# Altium footprint library con-molex.PCBLIB: 368 footprints (part 1 of 26)
Each footprint in its own frame and in the unit in brackets; x right, y up, seen from the top. Pads: shape width x height; smd on the part's side, far side on the other; paste and mask are expansions set on the pad; w line width, h text height; cw(c..) or ccw(c..) is an arc to the next point about the centre after c.
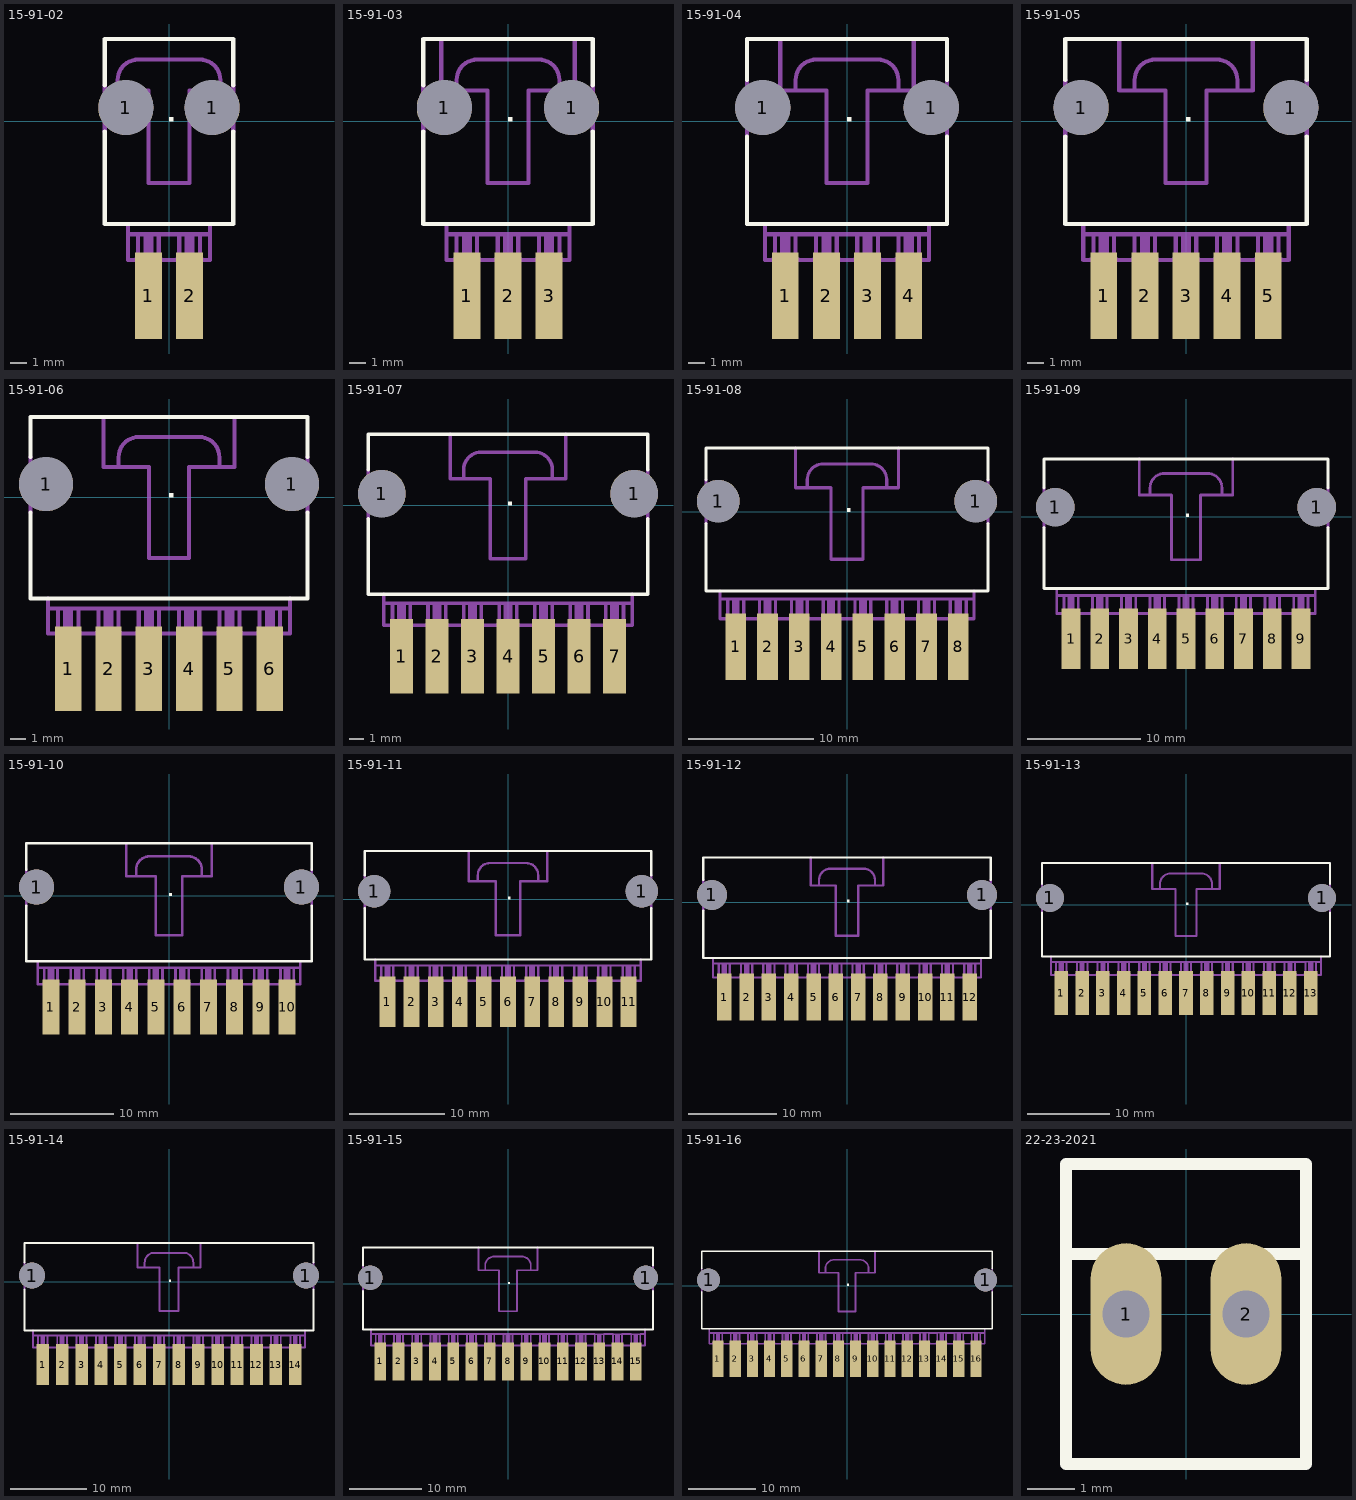
[diagram p0: the footprints below, top view; thin cyan lines are the x and y axes]

## 15-91-02 [mil]
pads (4):
  round 134 hole 134: 1(-105,33) 1(105,33)
  rect 65x210 smd: 1(-50,-425) 2(50,-425)
Top Overlay:
  region: 0,0 10,0 10,10 0,10
  lines w10: -156.25,-25 -156.25,-250 156.25,-250 156.25,-25 ; -156.25,87.5 -156.25,200 156.25,200 156.25,87.5
Mechanical 16:
  rectangle: -62.5,-425 -37.5,-275
  rectangle: 37.5,-425 62.5,-275
  lines w10: -156.25,-25 -156.25,75 ; -156.25,87.5 -156.25,75 ; -100,-275 -75,-275 ; -100,-250 -100,-337.5 -85,-337.5 ccw(c-85,-327.5) -75,-327.5 -75,-275 ; 100,-275 75,-275 ; 100,-250 100,-337.5 85,-337.5 cw(c85,-327.5) 75,-327.5 75,-275 ; 156.25,-25 156.25,75 ; 156.25,87.5 156.25,75 ; -156.25,75 -125,75 ; -125,75 -50,75 -50,-150 50,-150 50,75 125,75 ; -125,75 -125,100 cw(c-75,100) -75,150 75,150 cw(c75,100) 125,100 125,75 ; -75,-275 -25,-275 ; -25,-275 25,-275 ; -25,-275 -25,-327.5 ccw(c-15,-327.5) -15,-337.5 15,-337.5 ccw(c15,-327.5) 25,-327.5 25,-275 ; 25,-275 75,-275 ; 125,75 156.25,75

## 15-91-03 [mil]
pads (5):
  round 134 hole 134: 1(-155,33) 1(155,33)
  rect 65x210 smd: 1(-100,-425) 2(0,-425) 3(100,-425)
Top Overlay:
  region: 0,0 10,0 10,10 0,10
  lines w10: -206.25,-25 -206.25,-250 206.25,-250 206.25,-25 ; -206.25,87.5 -206.25,200 206.25,200 206.25,87.5
Mechanical 16:
  rectangle: -112.5,-425 -87.5,-275
  rectangle: -12.5,-425 12.5,-275
  rectangle: 87.5,-425 112.5,-275
  lines w10: -206.25,-25 -206.25,87.5 ; -162.5,200 -162.5,75 -125,75 ; -150,-275 -125,-275 ; -150,-250 -150,-337.5 -135,-337.5 ccw(c-135,-327.5) -125,-327.5 -125,-275 ; 150,-275 125,-275 ; 150,-250 150,-337.5 135,-337.5 cw(c135,-327.5) 125,-327.5 125,-275 ; 162.5,200 162.5,75 125,75 ; 206.25,-25 206.25,87.5 ; -125,-275 -75,-275 ; -125,75 -50,75 -50,-150 50,-150 50,75 125,75 ; -125,75 -125,100 cw(c-75,100) -75,150 75,150 cw(c75,100) 125,100 125,75 ; -75,-275 -25,-275 ; -75,-275 -75,-327.5 ccw(c-65,-327.5) -65,-337.5 -35,-337.5 ccw(c-35,-327.5) -25,-327.5 -25,-275 ; -25,-275 25,-275 ; 25,-275 75,-275 ; 25,-275 25,-327.5 ccw(c35,-327.5) 35,-337.5 65,-337.5 ccw(c65,-327.5) 75,-327.5 75,-275 ; 75,-275 125,-275

## 15-91-04 [mil]
pads (6):
  round 134 hole 134: 1(-205,33) 1(205,33)
  rect 65x210 smd: 1(-150,-425) 2(-50,-425) 3(50,-425) 4(150,-425)
Top Overlay:
  region: 0,0 10,0 10,10 0,10
  lines w10: -243.75,-37.5 -243.75,-250 243.75,-250 243.75,-37.5 ; -243.75,100 -243.75,200 243.75,200 243.75,100
Mechanical 16:
  rectangle: -162.5,-425 -137.5,-275
  rectangle: -62.5,-425 -37.5,-275
  rectangle: 37.5,-425 62.5,-275
  rectangle: 137.5,-425 162.5,-275
  lines w10: -243.75,-37.5 -243.75,100 ; -200,-275 -175,-275 ; -200,-250 -200,-337.5 -185,-337.5 ccw(c-185,-327.5) -175,-327.5 -175,-275 ; -162.5,200 -162.5,75 -125,75 ; 162.5,200 162.5,75 125,75 ; 200,-275 175,-275 ; 200,-250 200,-337.5 185,-337.5 cw(c185,-327.5) 175,-327.5 175,-275 ; 243.75,-37.5 243.75,100 ; -175,-275 -125,-275 ; -125,-275 -75,-275 ; -125,-275 -125,-327.5 ccw(c-115,-327.5) -115,-337.5 -85,-337.5 ccw(c-85,-327.5) -75,-327.5 -75,-275 ; -125,75 -50,75 -50,-150 50,-150 50,75 125,75 ; -125,75 -125,100 cw(c-75,100) -75,150 75,150 cw(c75,100) 125,100 125,75 ; -75,-275 -25,-275 ; -25,-275 -25,-327.5 ccw(c-15,-327.5) -15,-337.5 15,-337.5 ccw(c15,-327.5) 25,-327.5 25,-275 ; -25,-275 25,-275 ; 25,-275 75,-275 ; 75,-275 125,-275 ; 75,-275 75,-327.5 ccw(c85,-327.5) 85,-337.5 115,-337.5 ccw(c115,-327.5) 125,-327.5 125,-275 ; 125,-275 175,-275

## 15-91-05 [mil]
pads (7):
  round 134 hole 134: 1(-255,33) 1(255,33)
  rect 65x210 smd: 1(-200,-425) 2(-100,-425) 3(0,-425) 4(100,-425) 5(200,-425)
Top Overlay:
  region: 0,0 10,0 10,10 0,10
  lines w10: -293.75,-37.5 -293.75,-250 293.75,-250 293.75,-37.5 ; -293.75,100 -293.75,200 293.75,200 293.75,100
Mechanical 16:
  rectangle: -212.5,-425 -187.5,-275
  rectangle: -112.5,-425 -87.5,-275
  rectangle: -12.5,-425 12.5,-275
  rectangle: 87.5,-425 112.5,-275
  rectangle: 187.5,-425 212.5,-275
  lines w10: -293.75,-37.5 -293.75,100 ; -250,-275 -225,-275 ; -250,-250 -250,-337.5 -235,-337.5 ccw(c-235,-327.5) -225,-327.5 -225,-275 ; -162.5,200 -162.5,75 -125,75 ; 162.5,200 162.5,75 125,75 ; 250,-275 225,-275 ; 250,-250 250,-337.5 235,-337.5 cw(c235,-327.5) 225,-327.5 225,-275 ; 293.75,-37.5 293.75,100 ; -225,-275 -175,-275 ; -175,-275 -125,-275 ; -175,-275 -175,-327.5 ccw(c-165,-327.5) -165,-337.5 -135,-337.5 ccw(c-135,-327.5) -125,-327.5 -125,-275 ; -125,-275 -75,-275 ; -125,75 -50,75 -50,-150 50,-150 50,75 125,75 ; -125,75 -125,100 cw(c-75,100) -75,150 75,150 cw(c75,100) 125,100 125,75 ; -75,-275 -75,-327.5 ccw(c-65,-327.5) -65,-337.5 -35,-337.5 ccw(c-35,-327.5) -25,-327.5 -25,-275 ; -75,-275 -25,-275 ; -25,-275 25,-275 ; 25,-275 75,-275 ; 25,-275 25,-327.5 ccw(c35,-327.5) 35,-337.5 65,-337.5 ccw(c65,-327.5) 75,-327.5 75,-275 ; 75,-275 125,-275 ; 125,-275 175,-275 ; 125,-275 125,-327.5 ccw(c135,-327.5) 135,-337.5 165,-337.5 ccw(c165,-327.5) 175,-327.5 175,-275 ; 175,-275 225,-275

## 15-91-06 [mil]
pads (8):
  round 134 hole 134: 1(-305,33) 1(305,33)
  rect 65x210 smd: 1(-250,-425) 2(-150,-425) 3(-50,-425) 4(50,-425) 5(150,-425) 6(250,-425)
Top Overlay:
  region: 0,0 10,0 10,10 0,10
  lines w10: -343.75,-37.5 -343.75,-250 343.75,-250 343.75,-37.5 ; -343.75,100 -343.75,200 343.75,200 343.75,100
Mechanical 16:
  rectangle: -262.5,-425 -237.5,-275
  rectangle: -162.5,-425 -137.5,-275
  rectangle: -62.5,-425 -37.5,-275
  rectangle: 37.5,-425 62.5,-275
  rectangle: 137.5,-425 162.5,-275
  rectangle: 237.5,-425 262.5,-275
  lines w10: -343.75,-37.5 -343.75,100 ; -300,-275 -275,-275 ; -300,-250 -300,-337.5 -285,-337.5 ccw(c-285,-327.5) -275,-327.5 -275,-275 ; -162.5,200 -162.5,75 -125,75 ; 162.5,200 162.5,75 125,75 ; 300,-275 275,-275 ; 300,-250 300,-337.5 285,-337.5 cw(c285,-327.5) 275,-327.5 275,-275 ; 343.75,-37.5 343.75,100 ; -275,-275 -225,-275 ; -225,-275 -175,-275 ; -225,-275 -225,-327.5 ccw(c-215,-327.5) -215,-337.5 -185,-337.5 ccw(c-185,-327.5) -175,-327.5 -175,-275 ; -175,-275 -125,-275 ; -125,-275 -125,-327.5 ccw(c-115,-327.5) -115,-337.5 -85,-337.5 ccw(c-85,-327.5) -75,-327.5 -75,-275 ; -125,-275 -75,-275 ; -125,75 -50,75 -50,-150 50,-150 50,75 125,75 ; -125,75 -125,100 cw(c-75,100) -75,150 75,150 cw(c75,100) 125,100 125,75 ; -75,-275 -25,-275 ; -25,-275 25,-275 ; -25,-275 -25,-327.5 ccw(c-15,-327.5) -15,-337.5 15,-337.5 ccw(c15,-327.5) 25,-327.5 25,-275 ; 25,-275 75,-275 ; 75,-275 75,-327.5 ccw(c85,-327.5) 85,-337.5 115,-337.5 ccw(c115,-327.5) 125,-327.5 125,-275 ; 75,-275 125,-275 ; 125,-275 175,-275 ; 175,-275 225,-275 ; 175,-275 175,-327.5 ccw(c185,-327.5) 185,-337.5 215,-337.5 ccw(c215,-327.5) 225,-327.5 225,-275 ; 225,-275 275,-275

## 15-91-07 [mil]
pads (9):
  round 134 hole 134: 1(-355,33) 1(355,33)
  rect 65x210 smd: 1(-300,-425) 2(-200,-425) 3(-100,-425) 4(0,-425) 5(100,-425) 6(200,-425) 7(300,-425)
Top Overlay:
  region: 0,0 10,0 10,10 0,10
  lines w10: -393.75,-37.5 -393.75,-250 393.75,-250 393.75,-37.5 ; -393.75,100 -393.75,200 393.75,200 393.75,100
Mechanical 16:
  rectangle: -312.5,-425 -287.5,-275
  rectangle: -212.5,-425 -187.5,-275
  rectangle: -112.5,-425 -87.5,-275
  rectangle: 87.5,-425 112.5,-275
  rectangle: 187.5,-425 212.5,-275
  rectangle: 287.5,-425 312.5,-275
  rectangle: -12.5,-425 12.5,-275
  lines w10: -393.75,-37.5 -393.75,100 ; -350,-275 -325,-275 ; -350,-250 -350,-337.5 -335,-337.5 ccw(c-335,-327.5) -325,-327.5 -325,-275 ; -162.5,200 -162.5,75 -125,75 ; 162.5,200 162.5,75 125,75 ; 350,-250 350,-275 ; 393.75,-37.5 393.75,100 ; -325,-275 -275,-275 ; -275,-275 -225,-275 ; -275,-275 -275,-327.5 ccw(c-265,-327.5) -265,-337.5 -235,-337.5 ccw(c-235,-327.5) -225,-327.5 -225,-275 ; -225,-275 -175,-275 ; -175,-275 -125,-275 ; -175,-275 -175,-327.5 ccw(c-165,-327.5) -165,-337.5 -135,-337.5 ccw(c-135,-327.5) -125,-327.5 -125,-275 ; -125,-275 -75,-275 ; -125,75 -50,75 -50,-150 50,-150 50,75 125,75 ; -125,75 -125,100 cw(c-75,100) -75,150 75,150 cw(c75,100) 125,100 125,75 ; -75,-275 -75,-327.5 ccw(c-65,-327.5) -65,-337.5 -35,-337.5 ccw(c-35,-327.5) -25,-327.5 -25,-275 ; -75,-275 -25,-275 ; -25,-275 25,-275 ; 25,-275 75,-275 ; 25,-275 25,-327.5 ccw(c34.99,-327.51) 35,-337.5 65,-337.5 ccw(c65,-327.5) 75,-327.5 75,-275 ; 75,-275 125,-275 ; 125,-275 175,-275 ; 125,-275 125,-327.5 ccw(c135,-327.5) 135,-337.5 165,-337.5 ccw(c165,-327.5) 175,-327.5 175,-275 ; 175,-275 225,-275 ; 225,-275 275,-275 ; 225,-275 225,-327.5 ccw(c235,-327.5) 235,-337.5 265,-337.5 ccw(c265,-327.5) 275,-327.5 275,-275 ; 275,-275 325,-275 ; 325,-275 350,-275 ; 325,-275 325,-327.5 ccw(c335,-327.5) 335,-337.5 350,-337.5 350,-275

## 15-91-08 [mil]
pads (10):
  round 134 hole 134: 1(-405,33) 1(405,33)
  rect 65x210 smd: 1(-350,-425) 2(-250,-425) 3(-150,-425) 4(-50,-425) 5(50,-425) 6(150,-425) 7(250,-425) 8(350,-425)
Top Overlay:
  region: 0,0 10,0 10,10 0,10
  lines w10: -443.75,-37.5 -443.75,-250 443.75,-250 443.75,-37.5 ; -443.75,100 -443.75,200 443.75,200 443.75,100
Mechanical 16:
  rectangle: -362.5,-425 -337.5,-275
  rectangle: -262.5,-425 -237.5,-275
  rectangle: -162.5,-425 -137.5,-275
  rectangle: -62.5,-425 -37.5,-275
  rectangle: 37.5,-425 62.5,-275
  rectangle: 137.5,-425 162.5,-275
  rectangle: 237.5,-425 262.5,-275
  rectangle: 337.5,-425 362.5,-275
  lines w10: -443.75,-37.5 -443.75,100 ; -400,-275 -375,-275 ; -400,-250 -400,-337.5 -385,-337.5 ccw(c-385,-327.5) -375,-327.5 -375,-275 ; -162.5,200 -162.5,75 -125,75 ; 162.5,200 162.5,75 125,75 ; 400,-275 375,-275 ; 400,-250 400,-337.5 385,-337.5 cw(c385,-327.5) 375,-327.5 375,-275 ; 443.75,-37.5 443.75,100 ; -375,-275 -325,-275 ; -325,-275 -275,-275 ; -325,-275 -325,-327.5 ccw(c-315,-327.5) -315,-337.5 -285,-337.5 ccw(c-285,-327.5) -275,-327.5 -275,-275 ; -275,-275 -225,-275 ; -225,-275 -225,-327.5 ccw(c-215,-327.5) -215,-337.5 -185,-337.5 ccw(c-185,-327.5) -175,-327.5 -175,-275 ; -225,-275 -175,-275 ; -175,-275 -125,-275 ; -125,-275 -75,-275 ; -125,-275 -125,-327.5 ccw(c-115,-327.5) -115,-337.5 -85,-337.5 ccw(c-85,-327.5) -75,-327.5 -75,-275 ; -125,75 -50,75 -50,-150 50,-150 50,75 125,75 ; -125,75 -125,100 cw(c-75,100) -75,150 75,150 cw(c75,100) 125,100 125,75 ; -75,-275 -25,-275 ; -25,-275 -25,-327.5 ccw(c-15,-327.5) -15,-337.5 15,-337.5 ccw(c15,-327.5) 25,-327.5 25,-275 ; -25,-275 25,-275 ; 25,-275 75,-275 ; 75,-275 125,-275 ; 75,-275 75,-327.5 ccw(c85,-327.5) 85,-337.5 115,-337.5 ccw(c115,-327.5) 125,-327.5 125,-275 ; 125,-275 175,-275 ; 175,-275 175,-327.5 ccw(c185,-327.5) 185,-337.5 215,-337.5 ccw(c215,-327.5) 225,-327.5 225,-275 ; 175,-275 225,-275 ; 225,-275 275,-275 ; 275,-275 325,-275 ; 275,-275 275,-327.5 ccw(c285,-327.5) 285,-337.5 315,-337.5 ccw(c315,-327.5) 325,-327.5 325,-275 ; 325,-275 375,-275

## 15-91-09 [mil]
pads (11):
  round 134 hole 134: 1(-455,33) 1(455,33)
  rect 65x210 smd: 1(-400,-425) 2(-300,-425) 3(-200,-425) 4(-100,-425) 5(0,-425) 6(100,-425) 7(200,-425) 8(300,-425) 9(400,-425)
Top Overlay:
  region: 0,0 10,0 10,10 0,10
  lines w10: -493.75,-37.5 -493.75,-250 493.75,-250 493.75,-37.5 ; -493.75,100 -493.75,200 493.75,200 493.75,100
Mechanical 16:
  rectangle: -412.5,-425 -387.5,-275
  rectangle: -312.5,-425 -287.5,-275
  rectangle: -212.5,-425 -187.5,-275
  rectangle: -112.5,-425 -87.5,-275
  rectangle: -12.5,-425 12.5,-275
  rectangle: 87.5,-425 112.5,-275
  rectangle: 187.5,-425 212.5,-275
  rectangle: 287.5,-425 312.5,-275
  rectangle: 387.5,-425 412.5,-275
  lines w10: -493.75,-37.5 -493.75,100 ; -450,-275 -425,-275 ; -450,-250 -450,-337.5 -435,-337.5 ccw(c-435,-327.5) -425,-327.5 -425,-275 ; -162.5,200 -162.5,75 -125,75 ; 162.5,200 162.5,75 125,75 ; 450,-275 425,-275 ; 450,-250 450,-337.5 435,-337.5 cw(c435,-327.5) 425,-327.5 425,-275 ; 493.75,-37.5 493.75,100 ; -425,-275 -375,-275 ; -375,-275 -325,-275 ; -375,-275 -375,-327.5 ccw(c-365,-327.5) -365,-337.5 -335,-337.5 ccw(c-335,-327.5) -325,-327.5 -325,-275 ; -325,-275 -275,-275 ; -275,-275 -225,-275 ; -275,-275 -275,-327.5 ccw(c-265,-327.5) -265,-337.5 -235,-337.5 ccw(c-235,-327.5) -225,-327.5 -225,-275 ; -225,-275 -175,-275 ; -175,-275 -175,-327.5 ccw(c-165,-327.5) -165,-337.5 -135,-337.5 ccw(c-135,-327.5) -125,-327.5 -125,-275 ; -175,-275 -125,-275 ; -125,-275 -75,-275 ; -125,75 -50,75 -50,-150 50,-150 50,75 125,75 ; -125,75 -125,100 cw(c-75,100) -75,150 75,150 cw(c75,100) 125,100 125,75 ; -75,-275 -25,-275 ; -75,-275 -75,-327.5 ccw(c-65,-327.5) -65,-337.5 -35,-337.5 ccw(c-35,-327.5) -25,-327.5 -25,-275 ; -25,-275 25,-275 ; 25,-275 75,-275 ; 25,-275 25,-327.5 ccw(c35,-327.5) 35,-337.5 65,-337.5 ccw(c65,-327.5) 75,-327.5 75,-275 ; 75,-275 125,-275 ; 125,-275 125,-327.5 ccw(c135,-327.5) 135,-337.5 165,-337.5 ccw(c165,-327.5) 175,-327.5 175,-275 ; 125,-275 175,-275 ; 175,-275 225,-275 ; 225,-275 275,-275 ; 225,-275 225,-327.5 ccw(c235,-327.5) 235,-337.5 265,-337.5 ccw(c265,-327.5) 275,-327.5 275,-275 ; 275,-275 325,-275 ; 325,-275 375,-275 ; 325,-275 325,-327.5 ccw(c335,-327.5) 335,-337.5 365,-337.5 ccw(c365,-327.5) 375,-327.5 375,-275 ; 375,-275 425,-275

## 15-91-10 [mil]
pads (12):
  round 134 hole 134: 1(-505,33) 1(505,33)
  rect 65x210 smd: 1(-450,-425) 2(-350,-425) 3(-250,-425) 4(-150,-425) 5(-50,-425) 6(50,-425) 7(150,-425) 8(250,-425) 9(350,-425) 10(450,-425)
Top Overlay:
  region: 0,0 10,0 10,10 0,10
  lines w10: -543.75,-37.5 -543.75,-250 543.75,-250 543.75,-37.5 ; -543.75,100 -543.75,200 543.75,200 543.75,100
Mechanical 16:
  rectangle: -462.5,-425 -437.5,-275
  rectangle: -362.5,-425 -337.5,-275
  rectangle: -262.5,-425 -237.5,-275
  rectangle: -162.5,-425 -137.5,-275
  rectangle: -62.5,-425 -37.5,-275
  rectangle: 37.5,-425 62.5,-275
  rectangle: 137.5,-425 162.5,-275
  rectangle: 237.5,-425 262.5,-275
  rectangle: 337.5,-425 362.5,-275
  rectangle: 437.5,-425 462.5,-275
  lines w10: -543.75,-37.5 -543.75,100 ; -500,-275 -475,-275 ; -500,-250 -500,-337.5 -485,-337.5 ccw(c-485,-327.5) -475,-327.5 -475,-275 ; -162.5,200 -162.5,75 -125,75 ; 162.5,200 162.5,75 125,75 ; 500,-275 475,-275 ; 500,-250 500,-337.5 485,-337.5 cw(c485,-327.5) 475,-327.5 475,-275 ; 543.75,-37.5 543.75,100 ; -475,-275 -425,-275 ; -425,-275 -375,-275 ; -425,-275 -425,-327.5 ccw(c-415,-327.5) -415,-337.5 -385,-337.5 ccw(c-385,-327.5) -375,-327.5 -375,-275 ; -375,-275 -325,-275 ; -325,-275 -325,-327.5 ccw(c-315,-327.5) -315,-337.5 -285,-337.5 ccw(c-285,-327.5) -275,-327.5 -275,-275 ; -325,-275 -275,-275 ; -275,-275 -225,-275 ; -225,-275 -175,-275 ; -225,-275 -225,-327.5 ccw(c-215,-327.5) -215,-337.5 -185,-337.5 ccw(c-185,-327.5) -175,-327.5 -175,-275 ; -175,-275 -125,-275 ; -125,-275 -125,-327.5 ccw(c-115,-327.5) -115,-337.5 -85,-337.5 ccw(c-85,-327.5) -75,-327.5 -75,-275 ; -125,-275 -75,-275 ; -125,75 -50,75 -50,-150 50,-150 50,75 125,75 ; -125,75 -125,100 cw(c-75,100) -75,150 75,150 cw(c75,100) 125,100 125,75 ; -75,-275 -25,-275 ; -25,-275 25,-275 ; -25,-275 -25,-327.5 ccw(c-15,-327.5) -15,-337.5 15,-337.5 ccw(c15,-327.5) 25,-327.5 25,-275 ; 25,-275 75,-275 ; 75,-275 75,-327.5 ccw(c85,-327.5) 85,-337.5 115,-337.5 ccw(c115,-327.5) 125,-327.5 125,-275 ; 75,-275 125,-275 ; 125,-275 175,-275 ; 175,-275 225,-275 ; 175,-275 175,-327.5 ccw(c185,-327.5) 185,-337.5 215,-337.5 ccw(c215,-327.5) 225,-327.5 225,-275 ; 225,-275 275,-275 ; 275,-275 275,-327.5 ccw(c285,-327.5) 285,-337.5 315,-337.5 ccw(c315,-327.5) 325,-327.5 325,-275 ; 275,-275 325,-275 ; 325,-275 375,-275 ; 375,-275 425,-275 ; 375,-275 375,-327.5 ccw(c385,-327.5) 385,-337.5 415,-337.5 ccw(c415,-327.5) 425,-327.5 425,-275 ; 425,-275 475,-275

## 15-91-11 [mil]
pads (13):
  round 134 hole 134: 1(-555,33) 1(555,33)
  rect 65x210 smd: 1(-500,-425) 2(-400,-425) 3(-300,-425) 4(-200,-425) 5(-100,-425) 6(0,-425) 7(100,-425) 8(200,-425) 9(300,-425) 10(400,-425) 11(500,-425)
Top Overlay:
  region: 0,0 10,0 10,10 0,10
  lines w10: -593.75,-37.5 -593.75,-250 593.75,-250 593.75,-37.5 ; -593.75,100 -593.75,200 593.75,200 593.75,100
Mechanical 16:
  rectangle: -512.5,-425 -487.5,-275
  rectangle: -412.5,-425 -387.5,-275
  rectangle: -312.5,-425 -287.5,-275
  rectangle: 287.5,-425 312.5,-275
  rectangle: 387.5,-425 412.5,-275
  rectangle: 487.5,-425 512.5,-275
  rectangle: -212.5,-425 -187.5,-275
  rectangle: -112.5,-425 -87.5,-275
  rectangle: -12.5,-425 12.5,-275
  rectangle: 87.5,-425 112.5,-275
  rectangle: 187.5,-425 212.5,-275
  lines w10: -593.75,-37.5 -593.75,100 ; -550,-275 -525,-275 ; -550,-250 -550,-337.5 -535,-337.5 ccw(c-535,-327.5) -525,-327.5 -525,-275 ; -162.5,200 -162.5,75 -125,75 ; 162.5,200 162.5,75 125,75 ; 550,-275 525,-275 ; 550,-250 550,-337.5 535,-337.5 cw(c535,-327.5) 525,-327.5 525,-275 ; 593.75,-37.5 593.75,100 ; -525,-275 -475,-275 ; -475,-275 -425,-275 ; -475,-275 -475,-327.5 ccw(c-465,-327.5) -465,-337.5 -435,-337.5 ccw(c-435,-327.5) -425,-327.5 -425,-275 ; -425,-275 -375,-275 ; -375,-275 -325,-275 ; -375,-275 -375,-327.5 ccw(c-365,-327.5) -365,-337.5 -335,-337.5 ccw(c-335,-327.5) -325,-327.5 -325,-275 ; -325,-275 -275,-275 ; -275,-275 -275,-327.5 ccw(c-265,-327.5) -265,-337.5 -235,-337.5 ccw(c-235,-327.5) -225,-327.5 -225,-275 ; -275,-275 -225,-275 ; -225,-275 -175,-275 ; -175,-275 -125,-275 ; -175,-275 -175,-327.5 ccw(c-165,-327.5) -165,-337.5 -135,-337.5 ccw(c-135,-327.5) -125,-327.5 -125,-275 ; -125,-275 -75,-275 ; -125,75 -50,75 -50,-150 50,-150 50,75 125,75 ; -125,75 -125,100 cw(c-75,100) -75,150 75,150 cw(c75,100) 125,100 125,75 ; -75,-275 -25,-275 ; -75,-275 -75,-327.5 ccw(c-65,-327.5) -65,-337.5 -35,-337.5 ccw(c-35,-327.5) -25,-327.5 -25,-275 ; -25,-275 25,-275 ; 25,-275 25,-327.5 ccw(c35,-327.5) 35,-337.5 65,-337.5 ccw(c65,-327.5) 75,-327.5 75,-275 ; 25,-275 75,-275 ; 75,-275 125,-275 ; 125,-275 125,-327.5 ccw(c135,-327.5) 135,-337.5 165,-337.5 ccw(c165,-327.5) 175,-327.5 175,-275 ; 125,-275 175,-275 ; 175,-275 225,-275 ; 225,-275 275,-275 ; 225,-275 225,-327.5 ccw(c235,-327.5) 235,-337.5 265,-337.5 ccw(c265,-327.5) 275,-327.5 275,-275 ; 275,-275 325,-275 ; 325,-275 375,-275 ; 325,-275 325,-327.5 ccw(c335,-327.5) 335,-337.5 365,-337.5 ccw(c365,-327.5) 375,-327.5 375,-275 ; 375,-275 425,-275 ; 425,-275 475,-275 ; 425,-275 425,-327.5 ccw(c435,-327.5) 435,-337.5 465,-337.5 ccw(c465,-327.5) 475,-327.5 475,-275 ; 475,-275 525,-275

## 15-91-12 [mil]
pads (14):
  round 134 hole 134: 1(-605,33) 1(605,33)
  rect 65x210 smd: 1(-550,-425) 2(-450,-425) 3(-350,-425) 4(-250,-425) 5(-150,-425) 6(-50,-425) 7(50,-425) 8(150,-425) 9(250,-425) 10(350,-425) 11(450,-425) 12(550,-425)
Top Overlay:
  region: 0,0 10,0 10,10 0,10
  lines w10: -643.75,-37.5 -643.75,-250 643.75,-250 643.75,-37.5 ; -643.75,100 -643.75,200 643.75,200 643.75,100
Mechanical 16:
  rectangle: -562.5,-425 -537.5,-275
  rectangle: -462.5,-425 -437.5,-275
  rectangle: -362.5,-425 -337.5,-275
  rectangle: -262.5,-425 -237.5,-275
  rectangle: -162.5,-425 -137.5,-275
  rectangle: -62.5,-425 -37.5,-275
  rectangle: 37.5,-425 62.5,-275
  rectangle: 137.5,-425 162.5,-275
  rectangle: 237.5,-425 262.5,-275
  rectangle: 337.5,-425 362.5,-275
  rectangle: 437.5,-425 462.5,-275
  rectangle: 537.5,-425 562.5,-275
  lines w10: -643.75,-37.5 -643.75,100 ; -600,-275 -575,-275 ; -600,-250 -600,-337.5 -585,-337.5 ccw(c-585,-327.5) -575,-327.5 -575,-275 ; -162.5,200 -162.5,75 -125,75 ; 162.5,200 162.5,75 125,75 ; 600,-275 575,-275 ; 600,-250 600,-337.5 585,-337.5 cw(c585,-327.5) 575,-327.5 575,-275 ; 643.75,-37.5 643.75,100 ; -575,-275 -525,-275 ; -525,-275 -475,-275 ; -525,-275 -525,-327.5 ccw(c-515,-327.5) -515,-337.5 -485,-337.5 ccw(c-485,-327.5) -475,-327.5 -475,-275 ; -475,-275 -425,-275 ; -425,-275 -425,-327.5 ccw(c-415,-327.5) -415,-337.5 -385,-337.5 ccw(c-385,-327.5) -375,-327.5 -375,-275 ; -425,-275 -375,-275 ; -375,-275 -325,-275 ; -325,-275 -275,-275 ; -325,-275 -325,-327.5 ccw(c-315,-327.5) -315,-337.5 -285,-337.5 ccw(c-285,-327.5) -275,-327.5 -275,-275 ; -275,-275 -225,-275 ; -225,-275 -225,-327.5 ccw(c-215,-327.5) -215,-337.5 -185,-337.5 ccw(c-185,-327.5) -175,-327.5 -175,-275 ; -225,-275 -175,-275 ; -175,-275 -125,-275 ; -125,-275 -75,-275 ; -125,-275 -125,-327.5 ccw(c-115,-327.5) -115,-337.5 -85,-337.5 ccw(c-85,-327.5) -75,-327.5 -75,-275 ; -125,75 -50,75 -50,-150 50,-150 50,75 125,75 ; -125,75 -125,100 cw(c-75,100) -75,150 75,150 cw(c75,100) 125,100 125,75 ; -75,-275 -25,-275 ; -25,-275 -25,-327.5 ccw(c-15,-327.5) -15,-337.5 15,-337.5 ccw(c15,-327.5) 25,-327.5 25,-275 ; -25,-275 25,-275 ; 25,-275 75,-275 ; 75,-275 125,-275 ; 75,-275 75,-327.5 ccw(c85,-327.5) 85,-337.5 115,-337.5 ccw(c115,-327.5) 125,-327.5 125,-275 ; 125,-275 175,-275 ; 175,-275 175,-327.5 ccw(c185,-327.5) 185,-337.5 215,-337.5 ccw(c215,-327.5) 225,-327.5 225,-275 ; 175,-275 225,-275 ; 225,-275 275,-275 ; 275,-275 325,-275 ; 275,-275 275,-327.5 ccw(c285,-327.5) 285,-337.5 315,-337.5 ccw(c315,-327.5) 325,-327.5 325,-275 ; 325,-275 375,-275 ; 375,-275 375,-327.5 ccw(c385,-327.5) 385,-337.5 415,-337.5 ccw(c415,-327.5) 425,-327.5 425,-275 ; 375,-275 425,-275 ; 425,-275 475,-275 ; 475,-275 525,-275 ; 475,-275 475,-327.5 ccw(c485,-327.5) 485,-337.5 515,-337.5 ccw(c515,-327.5) 525,-327.5 525,-275 ; 525,-275 575,-275

## 15-91-13 [mil]
pads (15):
  round 134 hole 134: 1(-655,33) 1(655,33)
  rect 65x210 smd: 1(-600,-425) 2(-500,-425) 3(-400,-425) 4(-300,-425) 5(-200,-425) 6(-100,-425) 7(0,-425) 8(100,-425) 9(200,-425) 10(300,-425) 11(400,-425) 12(500,-425) 13(600,-425)
Top Overlay:
  region: 0,0 10,0 10,10 0,10
  lines w10: -693.75,-37.5 -693.75,-250 693.75,-250 693.75,-37.5 ; -693.75,100 -693.75,200 693.75,200 693.75,100
Mechanical 16:
  rectangle: -612.5,-425 -587.5,-275
  rectangle: -512.5,-425 -487.5,-275
  rectangle: -412.5,-425 -387.5,-275
  rectangle: -312.5,-425 -287.5,-275
  rectangle: -212.5,-425 -187.5,-275
  rectangle: -112.5,-425 -87.5,-275
  rectangle: -12.5,-425 12.5,-275
  rectangle: 87.5,-425 112.5,-275
  rectangle: 187.5,-425 212.5,-275
  rectangle: 287.5,-425 312.5,-275
  rectangle: 387.5,-425 412.5,-275
  rectangle: 487.5,-425 512.5,-275
  rectangle: 587.5,-425 612.5,-275
  lines w8: 575,-275 625,-275
  lines w10: -693.75,-37.5 -693.75,100 ; -650,-275 -625,-275 ; -650,-250 -650,-337.5 -635,-337.5 ccw(c-635,-327.5) -625,-327.5 -625,-275 ; -162.5,200 -162.5,75 -125,75 ; 162.5,200 162.5,75 125,75 ; 650,-275 625,-275 625,-327.5 ccw(c635,-327.5) 635,-337.5 650,-337.5 650,-250 ; 693.75,-37.5 693.75,100 ; -625,-275 -575,-275 ; -575,-275 -525,-275 ; -575,-275 -575,-327.5 ccw(c-565,-327.5) -565,-337.5 -535,-337.5 ccw(c-535,-327.5) -525,-327.5 -525,-275 ; -525,-275 -475,-275 ; -475,-275 -475,-327.5 ccw(c-465,-327.5) -465,-337.5 -435,-337.5 ccw(c-435,-327.5) -425,-327.5 -425,-275 ; -475,-275 -425,-275 ; -425,-275 -375,-275 ; -375,-275 -325,-275 ; -375,-275 -375,-327.5 ccw(c-365,-327.5) -365,-337.5 -335,-337.5 ccw(c-335,-327.5) -325,-327.5 -325,-275 ; -325,-275 -275,-275 ; -275,-275 -275,-327.5 ccw(c-265,-327.5) -265,-337.5 -235,-337.5 ccw(c-235,-327.5) -225,-327.5 -225,-275 ; -275,-275 -225,-275 ; -225,-275 -175,-275 ; -175,-275 -125,-275 ; -175,-275 -175,-327.5 ccw(c-165,-327.5) -165,-337.5 -135,-337.5 ccw(c-135,-327.5) -125,-327.5 -125,-275 ; -125,-275 -75,-275 ; -125,75 -50,75 -50,-150 50,-150 50,75 125,75 ; -125,75 -125,100 cw(c-75,100) -75,150 75,150 cw(c75,100) 125,100 125,75 ; -75,-275 -75,-327.5 ccw(c-65,-327.5) -65,-337.5 -35,-337.5 ccw(c-35,-327.5) -25,-327.5 -25,-275 ; -75,-275 -25,-275 ; -25,-275 25,-275 ; 25,-275 75,-275 ; 25,-275 25,-327.5 ccw(c35,-327.5) 35,-337.5 65,-337.5 ccw(c65,-327.5) 75,-327.5 75,-275 ; 75,-275 125,-275 ; 125,-275 125,-327.5 ccw(c135,-327.5) 135,-337.5 165,-337.5 ccw(c165,-327.5) 175,-327.5 175,-275 ; 125,-275 175,-275 ; 175,-275 225,-275 ; 225,-275 275,-275 ; 225,-275 225,-327.5 ccw(c235,-327.5) 235,-337.5 265,-337.5 ccw(c265,-327.5) 275,-327.5 275,-275 ; 275,-275 325,-275 ; 325,-275 325,-327.5 ccw(c335,-327.5) 335,-337.5 365,-337.5 ccw(c365,-327.5) 375,-327.5 375,-275 ; 325,-275 375,-275 ; 375,-275 425,-275 ; 425,-275 475,-275 ; 425,-275 425,-327.5 ccw(c435,-327.5) 435,-337.5 465,-337.5 ccw(c465,-327.5) 475,-327.5 475,-275 ; 475,-275 525,-275 ; 525,-275 575,-275 575,-327.5 cw(c565,-327.5) 565,-337.5 535,-337.5 cw(c535,-327.5) 525,-327.5 525,-275

## 15-91-14 [mil]
pads (16):
  round 134 hole 134: 1(-705,33) 1(705,33)
  rect 65x210 smd: 1(-650,-425) 2(-550,-425) 3(-450,-425) 4(-350,-425) 5(-250,-425) 6(-150,-425) 7(-50,-425) 8(50,-425) 9(150,-425) 10(250,-425) 11(350,-425) 12(450,-425) 13(550,-425) 14(650,-425)
Top Overlay:
  region: 0,0 10,0 10,10 0,10
  lines w10: -743.75,-37.5 -743.75,-250 743.75,-250 743.75,-37.5 ; -743.75,100 -743.75,200 743.75,200 743.75,100
Mechanical 16:
  rectangle: -662.5,-425 -637.5,-275
  rectangle: -562.5,-425 -537.5,-275
  rectangle: -462.5,-425 -437.5,-275
  rectangle: -362.5,-425 -337.5,-275
  rectangle: -262.5,-425 -237.5,-275
  rectangle: -162.5,-425 -137.5,-275
  rectangle: -62.5,-425 -37.5,-275
  rectangle: 37.5,-425 62.5,-275
  rectangle: 137.5,-425 162.5,-275
  rectangle: 237.5,-425 262.5,-275
  rectangle: 337.5,-425 362.5,-275
  rectangle: 437.5,-425 462.5,-275
  rectangle: 537.5,-425 562.5,-275
  rectangle: 637.5,-425 662.5,-275
  lines w8: 525,-275 575,-275 ; 625,-275 675,-275
  lines w10: -743.75,-37.5 -743.75,100 ; -700,-275 -675,-275 ; -700,-250 -700,-337.5 -685,-337.5 ccw(c-685,-327.5) -675,-327.5 -675,-275 ; -162.5,200 -162.5,75 -125,75 ; 162.5,200 162.5,75 125,75 ; 700,-275 675,-275 675,-327.5 ccw(c685,-327.5) 685,-337.5 700,-337.5 700,-250 ; 743.75,-37.5 743.75,100 ; -675,-275 -625,-275 ; -625,-275 -575,-275 ; -625,-275 -625,-327.5 ccw(c-615,-327.5) -615,-337.5 -585,-337.5 ccw(c-585,-327.5) -575,-327.5 -575,-275 ; -575,-275 -525,-275 ; -525,-275 -525,-327.5 ccw(c-515,-327.5) -515,-337.5 -485,-337.5 ccw(c-485,-327.5) -475,-327.5 -475,-275 ; -525,-275 -475,-275 ; -475,-275 -425,-275 ; -425,-275 -375,-275 ; -425,-275 -425,-327.5 ccw(c-415,-327.5) -415,-337.5 -385,-337.5 ccw(c-385,-327.5) -375,-327.5 -375,-275 ; -375,-275 -325,-275 ; -325,-275 -325,-327.5 ccw(c-315,-327.5) -315,-337.5 -285,-337.5 ccw(c-285,-327.5) -275,-327.5 -275,-275 ; -325,-275 -275,-275 ; -275,-275 -225,-275 ; -225,-275 -175,-275 ; -225,-275 -225,-327.5 ccw(c-215,-327.5) -215,-337.5 -185,-337.5 ccw(c-185,-327.5) -175,-327.5 -175,-275 ; -175,-275 -125,-275 ; -125,-275 -125,-327.5 ccw(c-115,-327.5) -115,-337.5 -85,-337.5 ccw(c-85,-327.5) -75,-327.5 -75,-275 ; -125,-275 -75,-275 ; -125,75 -50,75 -50,-150 50,-150 50,75 125,75 ; -125,75 -125,100 cw(c-75,100) -75,150 75,150 cw(c75,100) 125,100 125,75 ; -75,-275 -25,-275 ; -25,-275 25,-275 ; -25,-275 -25,-327.5 ccw(c-15,-327.5) -15,-337.5 15,-337.5 ccw(c15,-327.5) 25,-327.5 25,-275 ; 25,-275 75,-275 ; 75,-275 75,-327.5 ccw(c85,-327.5) 85,-337.5 115,-337.5 ccw(c115,-327.5) 125,-327.5 125,-275 ; 75,-275 125,-275 ; 125,-275 175,-275 ; 175,-275 225,-275 ; 175,-275 175,-327.5 ccw(c185,-327.5) 185,-337.5 215,-337.5 ccw(c215,-327.5) 225,-327.5 225,-275 ; 225,-275 275,-275 ; 275,-275 275,-327.5 ccw(c285,-327.5) 285,-337.5 315,-337.5 ccw(c315,-327.5) 325,-327.5 325,-275 ; 275,-275 325,-275 ; 325,-275 375,-275 ; 375,-275 425,-275 ; 375,-275 375,-327.5 ccw(c385,-327.5) 385,-337.5 415,-337.5 ccw(c415,-327.5) 425,-327.5 425,-275 ; 425,-275 475,-275 ; 475,-275 525,-275 525,-327.5 cw(c515,-327.5) 515,-337.5 485,-337.5 cw(c485,-327.5) 475,-327.5 475,-275 ; 575,-327.5 575,-275 625,-275 625,-327.5 cw(c615,-327.5) 615,-337.5 585,-337.5 cw(c585,-327.5) 575,-327.5

## 15-91-15 [mil]
pads (17):
  round 134 hole 134: 1(-755,33) 1(755,33)
  rect 65x210 smd: 1(-700,-425) 2(-600,-425) 3(-500,-425) 4(-400,-425) 5(-300,-425) 6(-200,-425) 7(-100,-425) 8(0,-425) 9(100,-425) 10(200,-425) 11(300,-425) 12(400,-425) 13(500,-425) 14(600,-425) 15(700,-425)
Top Overlay:
  region: 0,0 10,0 10,10 0,10
  lines w10: -793.75,-37.5 -793.75,-250 793.75,-250 793.75,-37.5 ; -793.75,100 -793.75,200 793.75,200 793.75,100
Mechanical 16:
  rectangle: -712.5,-425 -687.5,-275
  rectangle: -612.5,-425 -587.5,-275
  rectangle: -512.5,-425 -487.5,-275
  rectangle: -412.5,-425 -387.5,-275
  rectangle: -312.5,-425 -287.5,-275
  rectangle: -212.5,-425 -187.5,-275
  rectangle: -112.5,-425 -87.5,-275
  rectangle: -12.5,-425 12.5,-275
  rectangle: 87.5,-425 112.5,-275
  rectangle: 187.5,-425 212.5,-275
  rectangle: 287.5,-425 312.5,-275
  rectangle: 387.5,-425 412.5,-275
  rectangle: 487.5,-425 512.5,-275
  rectangle: 687.5,-425 712.5,-275
  rectangle: 587.5,-425 612.5,-275
  lines w8: 475,-275 525,-275 ; 575,-275 625,-275 ; 675,-275 725,-275
  lines w10: -793.75,-37.5 -793.75,100 ; -750,-275 -725,-275 ; -750,-250 -750,-337.5 -735,-337.5 ccw(c-735,-327.5) -725,-327.5 -725,-275 ; -162.5,200 -162.5,75 -125,75 ; 162.5,200 162.5,75 125,75 ; 750,-275 725,-275 725,-327.5 ccw(c735,-327.5) 735,-337.5 750,-337.5 750,-250 ; 793.75,-37.5 793.75,100 ; -725,-275 -675,-275 ; -675,-275 -625,-275 ; -675,-275 -675,-327.5 ccw(c-665,-327.5) -665,-337.5 -635,-337.5 ccw(c-635,-327.5) -625,-327.5 -625,-275 ; -625,-275 -575,-275 ; -575,-275 -575,-327.5 ccw(c-565,-327.5) -565,-337.5 -535,-337.5 ccw(c-535,-327.5) -525,-327.5 -525,-275 ; -575,-275 -525,-275 ; -525,-275 -475,-275 ; -475,-275 -425,-275 ; -475,-275 -475,-327.5 ccw(c-465,-327.5) -465,-337.5 -435,-337.5 ccw(c-435,-327.5) -425,-327.5 -425,-275 ; -425,-275 -375,-275 ; -375,-275 -375,-327.5 ccw(c-365,-327.5) -365,-337.5 -335,-337.5 ccw(c-335,-327.5) -325,-327.5 -325,-275 ; -375,-275 -325,-275 ; -325,-275 -275,-275 ; -275,-275 -225,-275 ; -275,-275 -275,-327.5 ccw(c-265,-327.5) -265,-337.5 -235,-337.5 ccw(c-235,-327.5) -225,-327.5 -225,-275 ; -225,-275 -175,-275 ; -175,-275 -175,-327.5 ccw(c-165,-327.5) -165,-337.5 -135,-337.5 ccw(c-135,-327.5) -125,-327.5 -125,-275 ; -175,-275 -125,-275 ; -125,-275 -75,-275 ; -125,75 -50,75 -50,-150 50,-150 50,75 125,75 ; -125,75 -125,100 cw(c-75,100) -75,150 75,150 cw(c75,100) 125,100 125,75 ; -75,-275 -25,-275 ; -75,-275 -75,-327.5 ccw(c-65,-327.5) -65,-337.5 -35,-337.5 ccw(c-35,-327.5) -25,-327.5 -25,-275 ; -25,-275 25,-275 ; 25,-275 25,-327.5 ccw(c35,-327.5) 35,-337.5 65,-337.5 ccw(c65,-327.5) 75,-327.5 75,-275 ; 25,-275 75,-275 ; 75,-275 125,-275 ; 125,-275 175,-275 ; 125,-275 125,-327.5 ccw(c135,-327.5) 135,-337.5 165,-337.5 ccw(c165,-327.5) 175,-327.5 175,-275 ; 175,-275 225,-275 ; 225,-275 225,-327.5 ccw(c235,-327.5) 235,-337.5 265,-337.5 ccw(c265,-327.5) 275,-327.5 275,-275 ; 225,-275 275,-275 ; 275,-275 325,-275 ; 325,-275 375,-275 ; 325,-275 325,-327.5 ccw(c335,-327.5) 335,-337.5 365,-337.5 ccw(c365,-327.5) 375,-327.5 375,-275 ; 375,-275 425,-275 ; 425,-275 475,-275 475,-327.5 cw(c465,-327.5) 465,-337.5 435,-337.5 cw(c435,-327.5) 425,-327.5 425,-275 ; 525,-327.5 525,-275 575,-275 575,-327.5 cw(c565,-327.5) 565,-337.5 535,-337.5 cw(c535,-327.5) 525,-327.5 ; 625,-327.5 625,-275 675,-275 675,-327.5 cw(c665,-327.5) 665,-337.5 635,-337.5 cw(c635,-327.5) 625,-327.5

## 15-91-16 [mil]
pads (18):
  round 134 hole 134: 1(-805,33) 1(805,33)
  rect 65x210 smd: 1(-750,-425) 2(-650,-425) 3(-550,-425) 4(-450,-425) 5(-350,-425) 6(-250,-425) 7(-150,-425) 8(-50,-425) 9(50,-425) 10(150,-425) 11(250,-425) 12(350,-425) 13(450,-425) 14(550,-425) 15(650,-425) 16(750,-425)
Top Overlay:
  region: 0,0 10,0 10,10 0,10
  lines w10: -843.75,-37.5 -843.75,-250 843.75,-250 843.75,-37.5 ; -843.75,100 -843.75,200 843.75,200 843.75,100
Mechanical 16:
  rectangle: -762.5,-425 -737.5,-275
  rectangle: -662.5,-425 -637.5,-275
  rectangle: -562.5,-425 -537.5,-275
  rectangle: -462.5,-425 -437.5,-275
  rectangle: -362.5,-425 -337.5,-275
  rectangle: -262.5,-425 -237.5,-275
  rectangle: -162.5,-425 -137.5,-275
  rectangle: -62.5,-425 -37.5,-275
  rectangle: 37.5,-425 62.5,-275
  rectangle: 137.5,-425 162.5,-275
  rectangle: 237.5,-425 262.5,-275
  rectangle: 337.5,-425 362.5,-275
  rectangle: 437.5,-425 462.5,-275
  rectangle: 737.5,-425 762.5,-275
  rectangle: 537.5,-425 562.5,-275
  rectangle: 637.5,-425 662.5,-275
  lines w8: 425,-275 475,-275 ; 525,-275 575,-275 ; 625,-275 675,-275 ; 725,-275 775,-275
  lines w10: -843.75,-37.5 -843.75,100 ; -800,-275 -775,-275 ; -800,-250 -800,-337.5 -785,-337.5 ccw(c-785,-327.5) -775,-327.5 -775,-275 ; -162.5,200 -162.5,75 -125,75 ; 162.5,200 162.5,75 125,75 ; 800,-275 775,-275 775,-327.5 ccw(c785,-327.5) 785,-337.5 800,-337.5 800,-250 ; 843.75,-37.5 843.75,100 ; -775,-275 -725,-275 ; -725,-275 -675,-275 ; -725,-275 -725,-327.5 ccw(c-715,-327.5) -715,-337.5 -685,-337.5 ccw(c-685,-327.5) -675,-327.5 -675,-275 ; -675,-275 -625,-275 ; -625,-275 -625,-327.5 ccw(c-615,-327.5) -615,-337.5 -585,-337.5 ccw(c-585,-327.5) -575,-327.5 -575,-275 ; -625,-275 -575,-275 ; -575,-275 -525,-275 ; -525,-275 -475,-275 ; -525,-275 -525,-327.5 ccw(c-515,-327.5) -515,-337.5 -485,-337.5 ccw(c-485,-327.5) -475,-327.5 -475,-275 ; -475,-275 -425,-275 ; -425,-275 -425,-327.5 ccw(c-415,-327.5) -415,-337.5 -385,-337.5 ccw(c-385,-327.5) -375,-327.5 -375,-275 ; -425,-275 -375,-275 ; -375,-275 -325,-275 ; -325,-275 -275,-275 ; -325,-275 -325,-327.5 ccw(c-315,-327.5) -315,-337.5 -285,-337.5 ccw(c-285,-327.5) -275,-327.5 -275,-275 ; -275,-275 -225,-275 ; -225,-275 -225,-327.5 ccw(c-215,-327.5) -215,-337.5 -185,-337.5 ccw(c-185,-327.5) -175,-327.5 -175,-275 ; -225,-275 -175,-275 ; -175,-275 -125,-275 ; -125,-275 -75,-275 ; -125,-275 -125,-327.5 ccw(c-115,-327.5) -115,-337.5 -85,-337.5 ccw(c-85,-327.5) -75,-327.5 -75,-275 ; -125,75 -50,75 -50,-150 50,-150 50,75 125,75 ; -125,75 -125,100 cw(c-75,100) -75,150 75,150 cw(c75,100) 125,100 125,75 ; -75,-275 -25,-275 ; -25,-275 -25,-327.5 ccw(c-15,-327.5) -15,-337.5 15,-337.5 ccw(c15,-327.5) 25,-327.5 25,-275 ; -25,-275 25,-275 ; 25,-275 75,-275 ; 75,-275 125,-275 ; 75,-275 75,-327.5 ccw(c85,-327.5) 85,-337.5 115,-337.5 ccw(c115,-327.5) 125,-327.5 125,-275 ; 125,-275 175,-275 ; 175,-275 175,-327.5 ccw(c185,-327.5) 185,-337.5 215,-337.5 ccw(c215,-327.5) 225,-327.5 225,-275 ; 175,-275 225,-275 ; 225,-275 275,-275 ; 275,-275 325,-275 ; 275,-275 275,-327.5 ccw(c285,-327.5) 285,-337.5 315,-337.5 ccw(c315,-327.5) 325,-327.5 325,-275 ; 325,-275 375,-275 ; 375,-275 425,-275 425,-327.5 cw(c415,-327.5) 415,-337.5 385,-337.5 cw(c385,-327.5) 375,-327.5 375,-275 ; 475,-327.5 475,-275 525,-275 525,-327.5 cw(c515,-327.5) 515,-337.5 485,-337.5 cw(c485,-327.5) 475,-327.5 ; 575,-327.5 575,-275 625,-275 625,-327.5 cw(c615,-327.5) 615,-337.5 585,-337.5 cw(c585,-327.5) 575,-327.5 ; 675,-327.5 675,-275 725,-275 725,-327.5 cw(c715,-327.5) 715,-337.5 685,-337.5 cw(c685,-327.5) 675,-327.5

## 22-23-2021 [mm]
pads (2):
  oval 1.5x3 hole 1: 1(-1.27,0) 2(1.27,0)
Top Overlay:
  lines w0.254: -2.54,1.27 -2.54,-3.175 2.54,-3.175 2.54,1.27 ; -2.54,1.27 -2.54,3.175 2.54,3.175 2.54,1.27 ; -2.54,1.27 2.54,1.27